# Altium integrated library A_Buf_Lib.IntLib: 4 symbols
Pins are listed as number, name and electrical type; pins without a type are passive.

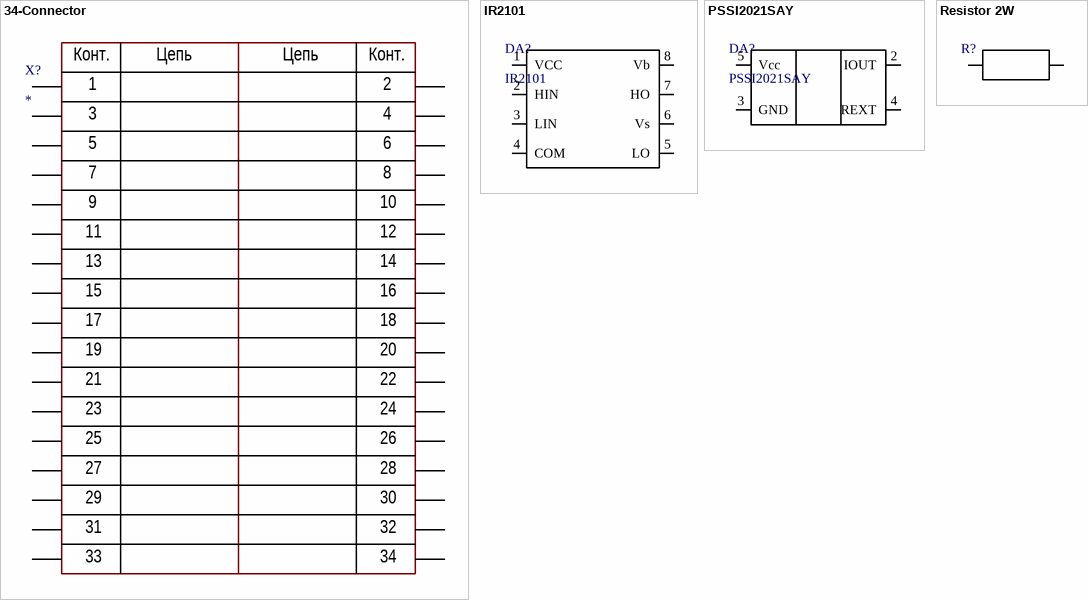
[diagram p0: symbols 34-Connector to Resistor 2W]

## 34-Connector
designator X?
pins: 1, 2, 3, 4, 5, 6, 7, 8, 9, 10, 11, 12, 13, 14, 15, 16, 17, 18, 19, 20, 21, 22, 23, 24, 25, 26, 27, 28, 29, 30, 31, 32, 33, 34
text: Конт.; Цепь

## IR2101
designator DA?
footprint SOIC8
pins: 1 VCC, 2 HIN, 3 LIN, 4 COM, 5 LO, 6 Vs, 7 HO, 8 Vb

## PSSI2021SAY
designator DA?
Iout = 0.617/Rext + 15 µA
pins: 2 IOUT, 3 GND, 4 REXT, 5 Vcc

## Resistor 2W
designator R?  (value not drawn)
footprint KNC-100
pins: 1, 2